# Altium footprint library WaterSupplyController.PcbLib: 37 footprints (part 3 of 3)
Each footprint in its own frame and in the unit in brackets; x right, y up, seen from the top. Pads: shape width x height; smd on the part's side, far side on the other; paste and mask are expansions set on the pad; w line width, h text height; cw(c..) or ccw(c..) is an arc to the next point about the centre after c.
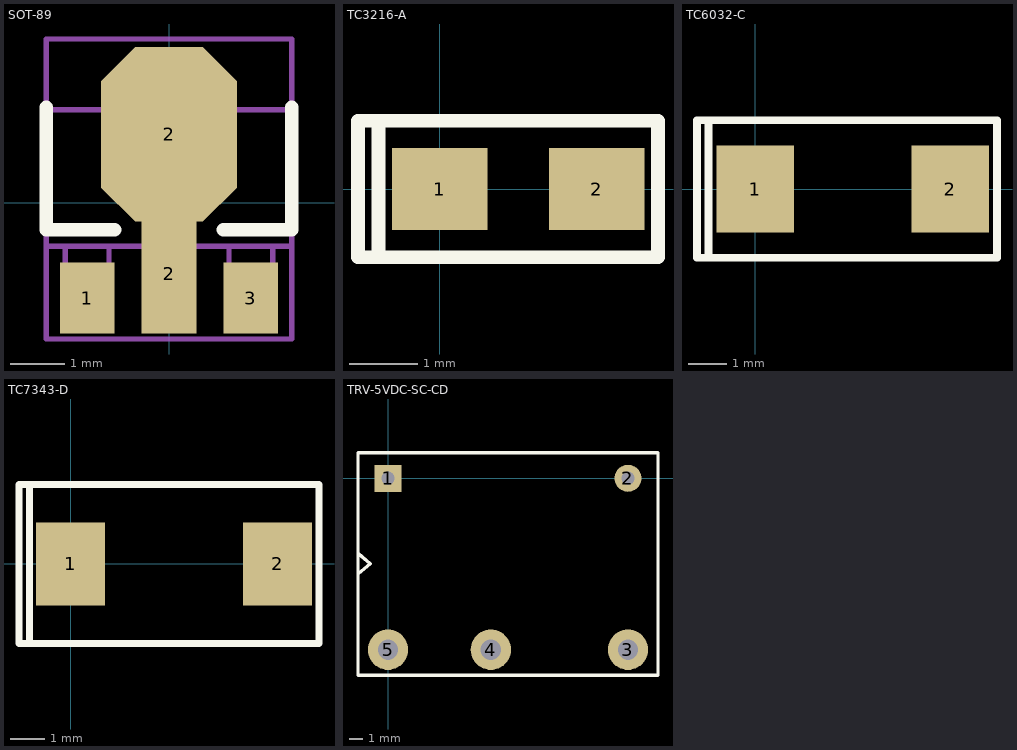
[diagram p2: the footprints below, top view; thin cyan lines are the x and y axes]

## SOT-89 [mm]
pads (4):
  rect 1x1.3 smd: 1(-1.5,-1.75) 3(1.5,-1.75)
  rect 1x2.2 smd: 2(0,-1.3)
  oct 2.5x3.2 smd: 2(0,1.25)
Top Overlay:
  lines w0.25: -2.25,1.75 -2.25,-0.5 -1,-0.5 ; 1,-0.5 2.25,-0.5 2.25,1.75
Mechanical 7:
  lines w0.05: -2.25,-2.5 -2.25,3 2.25,3 2.25,-2.5 -2.25,-2.5
  text ".Designator" at -1.5,-0.5 h1.5
Mechanical 13:
  lines w0.1: -1.9,-0.8 -1.9,-1.7 -1.1,-1.7 -1.1,-0.8 ; -1,1.7 -1,2 -0.4,2.6 0.4,2.6 1,2 1,1.7 ; -0.4,-0.8 -0.4,-1.7 0.4,-1.7 0.4,-0.8 ; 1.1,-0.8 1.1,-1.7 1.9,-1.7 1.9,-0.8 ; -2.25,-0.8 2.25,-0.8 2.25,1.7 -2.25,1.7 -2.25,-0.8
Mechanical 15:
  lines w0.1: -0.5,0 0.5,0 ; 0,-0.5 0,0.5 ; -2.25,-2.5 2.25,-2.5 2.25,3 -2.25,3 -2.25,-2.5
3D body "CircuitWorks-SOT-89.step": height 1.51, standoff 0.01, extent -2.25,-1.75 2.25,2.25

## TC3216-A [mm]
pads (2):
  rect 1.4x1.2 smd mask+0.025: 1(0,0) 2(2.3,0)
Top Overlay:
  lines w0.2: -0.9,-1 -0.9,1 ; -1.2,-1 -1.2,1 3.2,1 3.2,-1 -1.2,-1
3D body "User Library-CAP_TANT_3216-18_A_case-1.SLDPRT": height 1.7, standoff 0, extent -0.55,-0.9 2.85,0.9

## TC6032-C [mm]
pads (2):
  rect 2.03x2.28 smd mask+0.025: 1(0,0) 2(5.1,0)
Top Overlay:
  lines w0.2: -1.225,-1.8 -1.225,1.8 ; -1.525,-1.8 -1.525,1.8 6.325,1.8 6.325,-1.8 -1.525,-1.8
3D body "User Library-AVX_C_CASE.SLDPRT": height 2.7, standoff 0, extent -0.45,-1.675 5.65,1.675

## TC7343-D [mm]
pads (2):
  rect 2x2.4 smd mask+0.025: 1(0,0) 2(6,0)
Top Overlay:
  lines w0.2: -1.2,-2.3 -1.2,2.3 ; -1.5,-2.3 -1.5,2.3 7.2,2.3 7.2,-2.3 -1.5,-2.3
3D body "User Library-AVX_D_CASE.SLDPRT": height 3.01, standoff 0, extent -0.7,-2.225 6.7,2.225

## TRV-5VDC-SC-CD [mm]
pads (5):
  rect 2x2 hole 1 mask+0.025: 1(0,0)
  round 2 hole 1 mask+0.025: 2(17.78,0)
  round 3 hole 1.5 mask+0.025: 3(17.78,-12.7) 4(7.62,-12.7) 5(0,-12.7)
Top Overlay:
  lines w0.254: -2.222,-14.605 -2.222,1.905 ; -2.197,-14.61 20.002,-14.605 20.002,1.905 -2.197,1.9 ; -2.197,-7.08 -1.322,-6.33 -2.197,-5.58
3D body "hf8.stp": height 14.19, standoff -4.31, extent -9.419,-24.624 27.266,11.895